# Altium footprint library kalios.PcbLib: 404 footprints (part 7 of 26)
Each footprint in its own frame and in the unit in brackets; x right, y up, seen from the top. Pads: shape width x height; smd on the part's side, far side on the other; paste and mask are expansions set on the pad; w line width, h text height; cw(c..) or ccw(c..) is an arc to the next point about the centre after c.
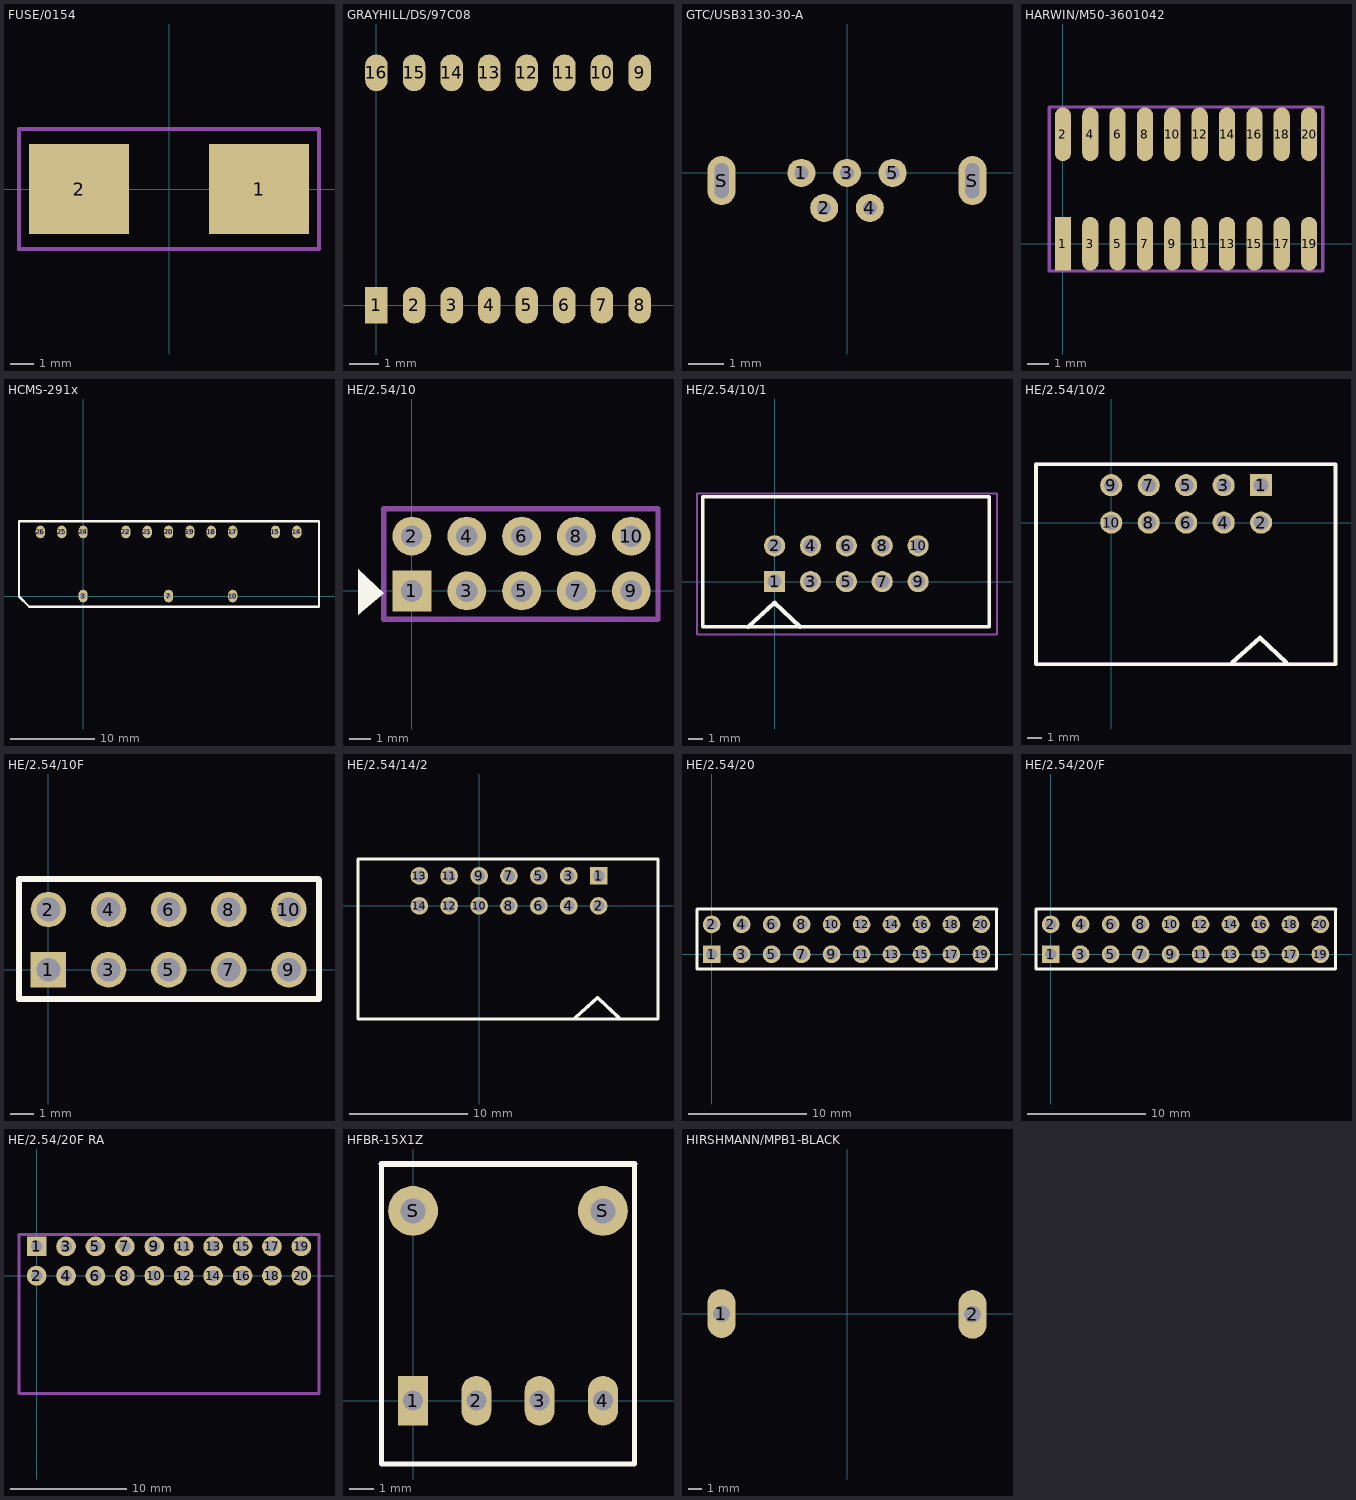
[diagram p6: the footprints below, top view; thin cyan lines are the x and y axes]

## FUSE/0154 [mm]
pads (2):
  rect 4.24x3.81 smd: 1(3.81,0) 2(-3.81,0)
Top Courtyard:
  lines w0.15: -6.35,-2.54 6.35,-2.54 6.35,2.54 -6.35,2.54 -6.35,-2.54
Top Designator:
  text ".Designator" at -7.618,-0.508 h1.52
3D body "Littlefuse 0154 Holder and Fuse.STEP": height 3.64, standoff -0.06, extent -4.85,-2.54 4.85,2.46

## FUSE/F4189 [mm]
Top Designator:
  text ".Designator" at -14.104,-0.692 h1.52
3D body "Fuse assembly.STEP": height 7.68, standoff -3.5, extent -14.926,-2.788 1.954,2.42

## GRAYHILL/DS/97C08 [mm]
pads (16):
  rect 0.76x1.245 smd: 1(0,0)
  oval 0.76x1.245 smd: 2(1.27,0) 3(2.54,0) 4(3.81,0) 5(5.08,0) 6(6.35,0) 7(7.62,0) 8(8.89,0) 9(8.89,7.85) 10(7.62,7.85) 11(6.35,7.85) 12(5.08,7.85) 13(3.81,7.85) 14(2.54,7.85) 15(1.27,7.85) 16(0,7.85)
Top Designator:
  text ".Designator" at -3.173,3.417 h1.52
3D body "User Library-HRM-08-T.STEP": height 2.4, standoff 0, extent -1.205,-0.25 10.095,7.95

## GTC/USB3130-30-A [mm]
pads (7):
  round 0.8 hole 0.4: 1(-1.3,0) 2(-0.65,-1) 3(0,0) 4(0.65,-1) 5(1.3,0)
  oval 0.8x1.4 hole 0.4 slot 1 at 90 deg: S(-3.575,-0.22) S(3.575,-0.22)
Top Designator:
  text ".Designator" at -7.618,-0.704 h1.52
3D body "USB3130.STEP": height 5.61, standoff -1.5, extent -3.973,-1.663 3.973,1.27

## HARWIN/M50-3601042 [mm]
pads (20):
  rect 0.75x2.5 smd: 1(0,0)
  oval 0.75x2.5 smd: 2(0,5.08) 3(1.27,0) 4(1.27,5.08) 5(2.54,0) 6(2.54,5.08) 7(3.81,0) 8(3.81,5.08) 9(5.08,0) 10(5.08,5.08) 11(6.35,0) 12(6.35,5.08) 13(7.62,0) 14(7.62,5.08) 15(8.89,0) 16(8.89,5.08) 17(10.16,0) 18(10.16,5.08) 19(11.43,0) 20(11.43,5.08)
Top Courtyard:
  lines w0.15: -0.635,-1.27 -0.635,6.35 12.065,6.35 12.065,-1.27 -0.635,-1.27
Top Designator:
  text ".Designator" at -1.903,2.032 h1.52
3D body "m50-3601042_asm.STEP": height 4.7, standoff 0.02, extent -0.635,-0.185 12.065,5.315

## HCMS-291x [mm]
height 5.08
pads (14):
  oval 1.1x1.5 hole 0.7: 3(0,0) 7(10.16,0) 10(17.78,0) 14(25.4,7.62) 15(22.86,7.62) 17(17.78,7.62) 18(15.24,7.62) 19(12.7,7.62) 20(10.16,7.62) 21(7.62,7.62) 22(5.08,7.62) 24(0,7.62) 25(-2.54,7.62) 26(-5.08,7.62)
Top Overlay:
  lines w0.254: -7.62,-0.051 -7.62,8.89 28.042,8.89 28.042,-1.27 -6.401,-1.27 -7.62,-0.051
Top Designator:
  text ".Designator" at 2.593,3.302 h1.52
3D body "HCMS-2915.STEP": height 5.08, standoff -3.81, extent -7.62,-1.295 27.94,8.865

## HE/2.54/10 [mm]
pads (10):
  rect 1.8x1.9 hole 1: 1(0,0)
  round 1.8 hole 1: 2(0,2.54) 3(2.54,0) 4(2.54,2.54) 5(5.08,0) 6(5.08,2.54) 7(7.62,0) 8(7.62,2.54) 9(10.16,0) 10(10.16,2.54)
Top Overlay:
  region: -1.3,-0.1 -2.5,-1.1 -2.5,1
Top Courtyard:
  lines w0.254: -1.3,-1.3 -1.3,3.8 11.4,3.8 11.4,-1.3 -1.3,-1.3
Bottom Courtyard:
  lines w0.254: -1.3,-1.3 -1.3,3.8 11.4,3.8 11.4,-1.3 -1.3,-1.3
Top Designator:
  text ".Designator" at -3.104,0.742 h1.52
3D body "PR20205VBDN.STEP": height 8.3, standoff -2.62, extent -1.27,-1.27 11.43,3.81

## HE/2.54/10/1 [mm]
pads (10):
  rect 1.5x1.5 hole 1: 1(0,0)
  round 1.5 hole 1: 2(0,2.54) 3(2.54,0) 4(2.54,2.54) 5(5.08,0) 6(5.08,2.54) 7(7.62,0) 8(7.62,2.54) 9(10.16,0) 10(10.16,2.54)
Top Overlay:
  lines w0.254: -5.1,-3.2 -5.1,6 15.2,6 15.2,-3.2 -5.1,-3.2
  lines w0.3: -1.895,-3.206 0,-1.5 1.8,-3.2
Top Courtyard:
  lines w0.15: -5.5,-3.75 -5.5,6.25 15.75,6.25 15.75,-3.75 -5.5,-3.75
Top Designator:
  text ".Designator" at -2.493,0.742 h1.52
3D body "Tyco 1761603-23.STEP": height 9, standoff -2.81, extent -5.06,-3.219 15.26,6

## HE/2.54/10/2 [mm]
pads (10):
  rect 1.5x1.5 hole 1: 1(10.16,2.54)
  round 1.5 hole 1: 2(10.16,0) 3(7.62,2.54) 4(7.62,0) 5(5.08,2.54) 6(5.08,0) 7(2.54,2.54) 8(2.54,0) 9(0,2.54) 10(0,0)
Top Overlay:
  lines w0.254: -5.1,-9.601 15.2,-9.601 15.2,3.962 -5.1,3.962 -5.1,-9.601
  lines w0.3: 8.189,-9.505 10.084,-7.799 11.884,-9.499
Top Courtyard:
  lines w0.15: -5.105,3.962 -5.105,-9.525 -5.055,-9.576 15.215,-9.576 15.24,-9.55 15.24,3.912 15.164,3.988 -5.105,3.988
Top Designator:
  text ".Designator" at -2.568,-3.327 h1.52
3D body "Tyco 2-1761605-3.STEP": height 8.82, standoff -2.99, extent -5.06,-9.61 15.26,2.9

## HE/2.54/10F [mm]
pads (10):
  rect 1.5x1.5 hole 1: 1(0,0)
  round 1.5 hole 1: 2(0,2.54) 3(2.54,0) 4(2.54,2.54) 5(5.08,0) 6(5.08,2.54) 7(7.62,0) 8(7.62,2.54) 9(10.16,0) 10(10.16,2.54)
Top Overlay:
  lines w0.254: 11.405,3.835 -1.245,3.835 -1.245,-1.245 11.43,-1.245 11.43,3.785
Top Designator:
  text ".Designator" at -2.512,0.788 h1.52
3D body "Samtec-SSW-105-01-G-D.STEP": height 8.51, standoff -2.64, extent -1.499,-1.27 11.709,3.683

## HE/2.54/14/2 [mm]
pads (14):
  rect 1.5x1.5 hole 1: 1(10.16,2.54)
  round 1.5 hole 1: 2(10.16,0) 3(7.62,2.54) 4(7.62,0) 5(5.08,2.54) 6(5.08,0) 7(2.54,2.54) 8(2.54,0) 9(0,2.54) 10(0,0) 11(-2.54,2.54) 12(-2.54,0) 13(-5.08,2.54) 14(-5.08,0)
Top Overlay:
  lines w0.254: -10.287,-9.601 -10.287,3.962 15.2,3.962 15.2,-9.601 -10.287,-9.601
  lines w0.3: 8.189,-9.505 10.084,-7.799 11.884,-9.499
Top Designator:
  text ".Designator" at -5.161,-3.327 h1.52
3D body "C-2-1761605-5.STEP": height 8.82, standoff -2.99, extent -10.185,-9.627 15.215,2.883

## HE/2.54/20 [mm]
pads (20):
  rect 1.5x1.5 hole 1: 1(0,0)
  round 1.5 hole 1: 2(0,2.54) 3(2.54,0) 4(2.54,2.54) 5(5.08,0) 6(5.08,2.54) 7(7.62,0) 8(7.62,2.54) 9(10.16,0) 10(10.16,2.54) 11(12.7,0) 12(12.7,2.54) 13(15.24,0) 14(15.24,2.54) 15(17.78,0) 16(17.78,2.54) 17(20.32,0) 18(20.32,2.54) 19(22.86,0) 20(22.86,2.54)
Top Overlay:
  lines w0.254: -1.245,-1.245 -1.245,3.835 24.181,3.835 24.155,3.835 24.155,-1.245 -1.245,-1.245
Top Designator:
  text ".Designator" at 3.851,0.788 h1.52
3D body "Samtec-TSW-108-11-G-D.STEP": height 3.35, standoff -13.16, extent -1.219,-1.245 24.181,3.835

## HE/2.54/20/F [mm]
pads (20):
  rect 1.5x1.5 hole 1: 1(0,0)
  round 1.5 hole 1: 2(0,2.54) 3(2.54,0) 4(2.54,2.54) 5(5.08,0) 6(5.08,2.54) 7(7.62,0) 8(7.62,2.54) 9(10.16,0) 10(10.16,2.54) 11(12.7,0) 12(12.7,2.54) 13(15.24,0) 14(15.24,2.54) 15(17.78,0) 16(17.78,2.54) 17(20.32,0) 18(20.32,2.54) 19(22.86,0) 20(22.86,2.54)
Top Overlay:
  lines w0.254: -1.245,-1.245 24.155,-1.245 24.155,3.835 24.181,3.835 -1.245,3.835 -1.245,-1.245
Top Designator:
  text ".Designator" at 3.838,0.788 h1.52
3D body "Alfred.STEP": height 8.51, standoff -2.64, extent -1.499,-1.194 24.409,3.759

## HE/2.54/20F RA [mm]
pads (20):
  rect 1.7x1.7 hole 1: 1(0,2.54)
  round 1.7 hole 1: 2(0,0) 3(2.54,2.54) 4(2.54,0) 5(5.08,2.54) 6(5.08,0) 7(7.62,2.54) 8(7.62,0) 9(10.16,2.54) 10(10.16,0) 11(12.7,2.54) 12(12.7,0) 13(15.24,2.54) 14(15.24,0) 15(17.78,2.54) 16(17.78,0) 17(20.32,2.54) 18(20.32,0) 19(22.86,2.54) 20(22.86,0)
Top Courtyard:
  lines w0.254: -1.524,-10.16 -1.524,3.556 24.384,3.556 24.384,-10.16 -1.524,-10.16
Top Designator:
  text ".Designator" at 3.812,-3.81 h1.52
3D body "C102LJBN-RC.STEP": height 5.08, standoff -3.15, extent -1.545,-10.058 24.355,2.782

## HFBR-15X1Z [mm]
height 7.6
pads (6):
  rect 1.2x2 hole 0.8: 1(0,0)
  oval 1.2x2 hole 0.8: 2(2.54,0) 3(5.08,0) 4(7.62,0)
  round 2 hole 1: S(0,7.62) S(7.62,7.62)
Top Overlay:
  lines w0.2: -1.27,9.5 -1.27,-2.54 8.89,-2.54 8.89,9.5
  lines w0.254: -1.27,9.5 8.89,9.5 -1.27,9.5
Top Designator:
  text ".Designator" at -4.631,6.096 h1.52
3D body "T-1521.STEP": height 7.5, standoff -3.5, extent -3.172,-2.845 9.144,16.053

## HIRSHMANN/MPB1-BLACK [mm]
pads (2):
  oval 2x3.5 hole 1.2: 1(-9,0) 2(9,-0.051)
Top Designator:
  text ".Designator" at -6.758,-0.783 h1.52
3D body "MPB1 BLACK.STEP": height 11, standoff -4.6, extent -9.28,-4.275 11.82,3.725